# Altium footprint library 我的封装库.PcbLib: 90 footprints (part 1 of 6)
Each footprint in its own frame and in the unit in brackets; x right, y up, seen from the top. Pads: shape width x height; smd on the part's side, far side on the other; paste and mask are expansions set on the pad; w line width, h text height; cw(c..) or ccw(c..) is an arc to the next point about the centre after c.
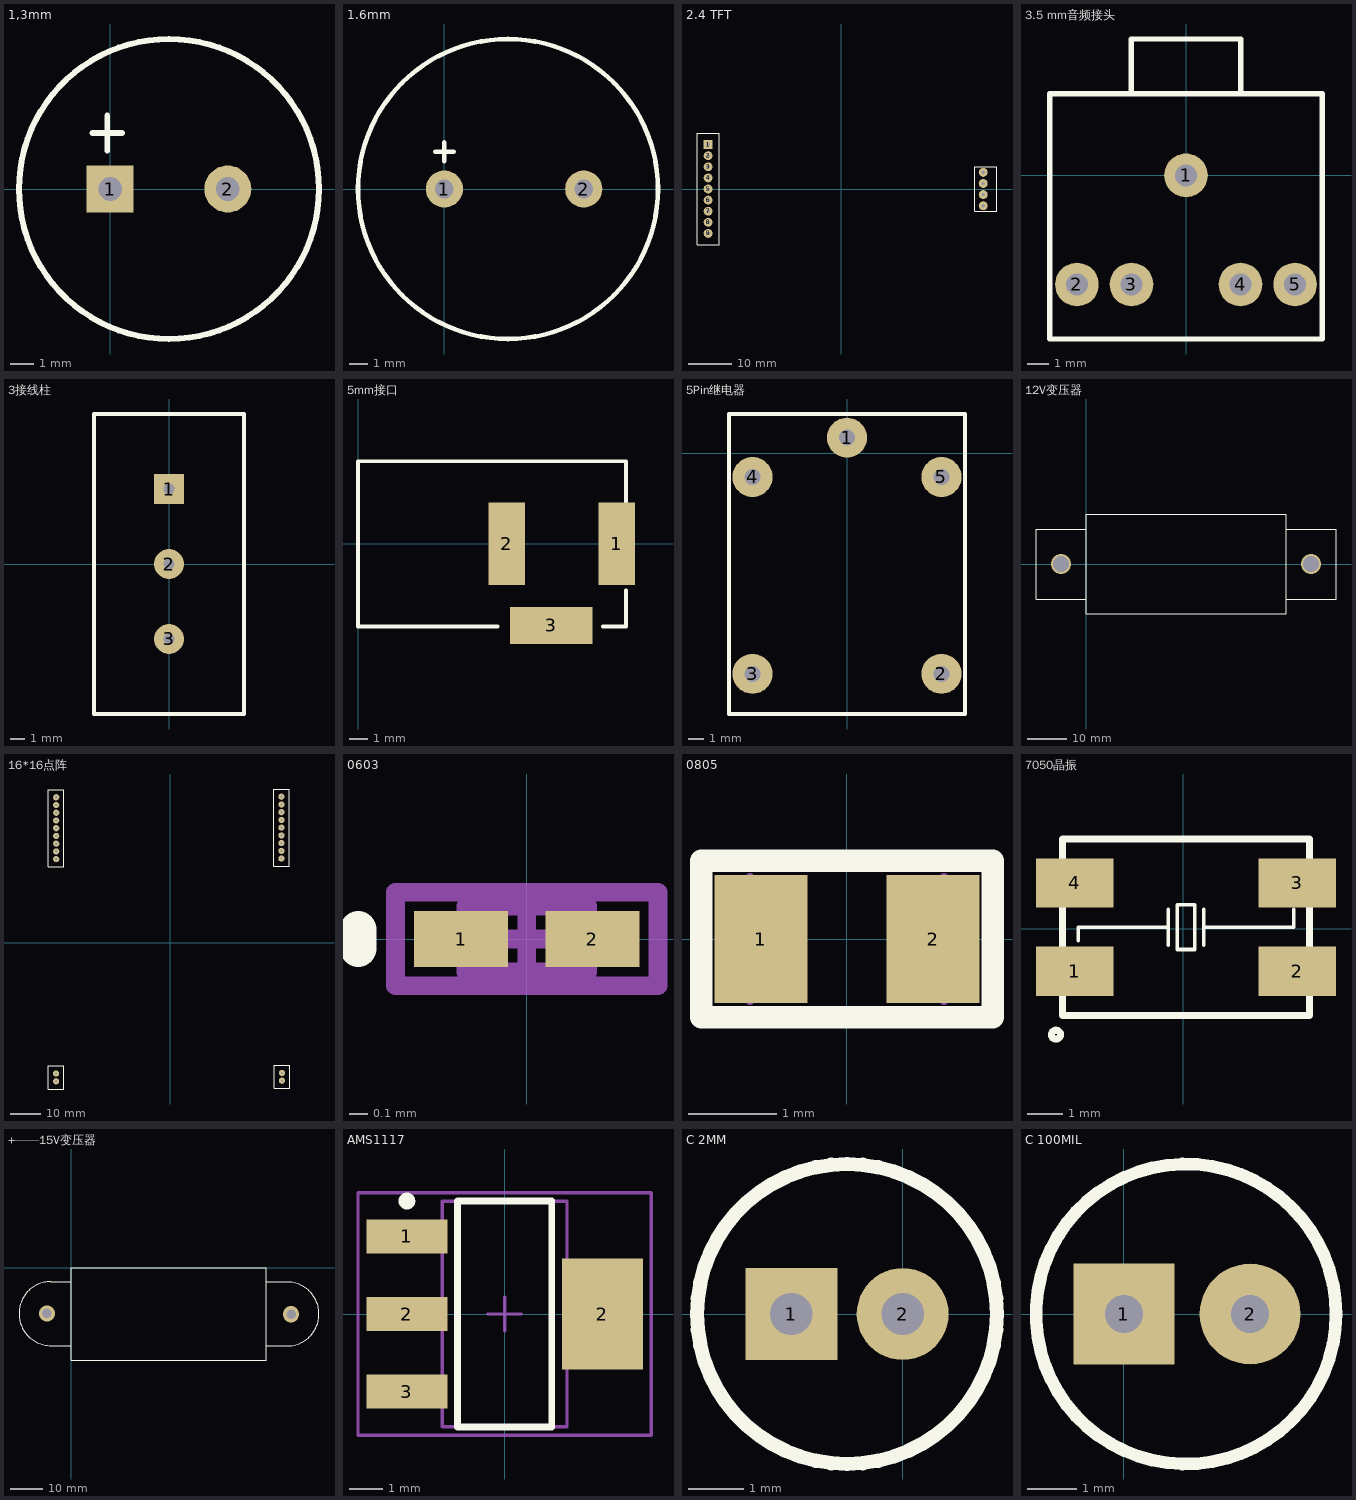
[diagram p0: the footprints below, top view; thin cyan lines are the x and y axes]

## 1,3mm [mil]
pads (2):
  rect 80x80 hole 40: 1(0,0)
  round 80 hole 40: 2(200,0)
Top Overlay:
  circle w10: c100,0 r255
  lines w10: -30,95 20,95 ; -5,65 -5,125

## 1.6mm [mil]
pads (2):
  round 80 hole 40: 1(0,0) 2(300,0)
Top Overlay:
  circle w10: c137,0 r323
  lines w10: -20,80 20,80 ; 0,60 0,100

## 2.4 TFT [mil]
pads (13):
  rect 80x80 hole 30: 1(-1200,400)
  round 80 hole 30: 2(-1200,300) 3(-1200,200) 4(-1200,100) 5(-1200,0) 6(-1200,-100) 7(-1200,-200) 8(-1200,-300) 9(-1200,-400) 10(1275.59,-150.18) 11(1275.59,-50.18) 12(1275.59,49.82) 13(1275.59,149.82)
Top Overlay:
  lines w10: -1188.98,0 -1181.1,0 ; -1300,-500 -1100,-500 -1100,500 -1300,500 -1300,-500 ; 1200,-200 1400,-200 1400,200 1200,200 1200,-200

## 3.5 mm音频接头 [mil]
pads (5):
  round 80 hole 40: 1(0,0) 2(-200,-200) 3(-100,-200) 4(100,-200) 5(200,-200)
Top Overlay:
  lines w10: -100,150 -100,250 100,250 100,150 ; -250,-300 -250,150 250,150 250,-300 -250,-300

## 3接线柱 [mil]
pads (3):
  rect 80x80 hole 30: 1(0,200)
  round 80 hole 30: 2(0,0) 3(0,-200)
Top Overlay:
  lines w10: -200,-400 -200,400 200,400 200,-400 -200,-400

## 5mm接口 [mm]
pads (3):
  rect 2x4.5 all layers, no hole: 1(14.097,0) 2(8.112,0)
  rect 4.5x2 all layers, no hole: 3(10.541,-4.445)
Top Overlay:
  lines w0.2: 7.62,-4.5 0,-4.5 0,4.5 14.6,4.5 14.6,2.2 ; 13.335,-4.5 14.6,-4.5 14.6,-2.54

## 5Pin继电器 [mm]
pads (5):
  round 2.54 hole 1.016: 1(0,1) 2(6,-14) 3(-6,-14) 4(-6,-1.5) 5(6,-1.5)
Top Overlay:
  lines w0.254: -7.5,-16.55 -7.5,2.5 7.5,2.5 7.5,-16.55 -7.5,-16.55

## 12V变压器 [mil]
via -250,0 diameter 196.85 hole 157.48
via 2250,0 diameter 196.85 hole 157.48
Top Overlay:
  lines w10: 0,-350 -500,-350 -500,-100 -500,350 0,350 ; 2000,-350 2500,-350 2500,350 2000,350 ; 0,-500 0,500 2000,500 2000,-500 0,-500

## 16*16点阵 [mil]
height 393.7
pads (22):
  round 80 hole 30: 1(-1476.38,1882.68) 2(-1476.38,1782.68) 3(-1476.38,1682.68) 4(-1476.38,1582.68) 5(-1476.38,1482.68) 6(-1476.38,1382.68) 7(-1476.38,1282.68) 8(-1476.38,1182.68) 9(-1476.38,1082.68) 10(-1477.95,-1690.55) 11(-1477.95,-1790.55) 12(1443.31,-1783.46) 13(1443.31,-1683.46) 14(1437.01,1089.76) 15(1437.01,1189.76) 16(1437.01,1289.76) 17(1437.01,1389.76) 18(1437.01,1489.76) 19(1437.01,1589.76) 20(1437.01,1689.76) 21(1437.01,1789.76) 22(1437.01,1889.76)
Top Overlay:
  lines w10: -1476.38,-1692.91 -1476.38,-1673.23 ; -1577.95,-1890.55 -1377.95,-1890.55 -1377.95,-1590.55 -1577.95,-1590.55 -1577.95,-1890.55 ; -1576.38,982.68 -1376.38,982.68 -1376.38,1982.68 -1576.38,1982.68 -1576.38,982.68 ; 1337.01,989.76 1537.01,989.76 1537.01,1989.76 1337.01,1989.76 1337.01,989.76 ; 1343.31,-1883.46 1543.31,-1883.46 1543.31,-1583.46 1343.31,-1583.46 1343.31,-1883.46

## 0603 [mm]
pads (2):
  rect 0.5x0.3 smd: 1(-0.35,0) 2(0.35,0)
Top Overlay:
  lines w0.2: -0.9,-0.05 -0.9,0.05
Mechanical 13:
  lines w0.1: -0.325,-0.175 0.325,-0.175 0.325,0.175 -0.325,0.175 -0.325,-0.175
Mechanical 15:
  lines w0.1: -0.175,0 0.175,0 ; 0,-0.175 0,0.175 ; -0.7,-0.25 0.7,-0.25 0.7,0.25 -0.7,0.25 -0.7,-0.25
3D body: height 0.55, standoff 0, extent -0.325,-0.175 0.325,0.175

## 0805 [mm] "Chip Capacitor, 2-Leads, Body 2.0x1.3mm, IPC Medium Density"
height 0.6
pads (2):
  rect 1.05x1.45 smd: 1(-0.975,0) 2(0.975,0)
Top Overlay:
  lines w0.254: -1.651,-0.889 1.651,-0.889 1.651,0.889 -1.651,0.889 -1.651,-0.889
Mechanical 13:
  lines w0.1: -1.1,-0.7 -1.1,0.7 ; 1.1,-0.7 1.1,0.7

## 7050晶振 [mm]
pads (4):
  rect 2.2x1.4 smd: 1(-3.074,-1.21) 2(3.226,-1.21) 3(3.226,1.29) 4(-3.074,1.29)
Top Overlay:
  circle w0.2: c-3.607,-3.008 r0.127
  lines w0.1: -2.972,-0.341 -2.972,0.04 -0.432,0.04 ; -0.432,-0.468 -0.432,0.548 ; 0.584,-0.468 0.584,0.548 ; 0.584,0.04 3.124,0.04 3.124,0.548 ; -0.178,-0.595 0.33,-0.595 0.33,0.675 -0.178,0.675 -0.178,-0.595
  lines w0.2: -3.424,-2.46 -3.424,2.54 3.576,2.54 3.576,-2.46 -3.424,-2.46
3D body: height 1.31, standoff 0, extent -3.5,-2.5 3.5,2.5

## +——15V变压器 [mil]
via -300,-555 diameter 196.85 hole 118.11
via 2680,-565 diameter 196.85 hole 118.11
Top Overlay:
  lines w10: -250,-950 0,-950 ; -250,-947.51 cw(c-250,-557.5) -250,-167.49 ; -250,-170 0,-170 ; 2380,-950 2630,-950 ; 2380,-170 2630,-170 ; 2630,-952.51 ccw(c2630,-562.5) 2630,-172.49 ; 0,-1125 2375,-1125 2375,0 0,0 0,-1125

## AMS1117 [mm]
pads (4):
  rect 2.4x1 smd: 1(-2.9,2.3) 2(-2.9,0) 3(-2.9,-2.3)
  rect 2.4x3.3 smd: 2(2.9,0)
Top Overlay:
  circle w0.25: c-2.9,3.35 r0.125
  lines w0.2: -1.4,-3.35 1.4,-3.35 1.4,3.35 -1.4,3.35 -1.4,-3.35
Mechanical 13:
  lines w0.1: -1.85,-3.35 1.85,-3.35 1.85,3.35 -1.85,3.35 -1.85,-3.35
Mechanical 15:
  lines w0.1: -0.5,0 0.5,0 ; 0,-0.5 0,0.5 ; -4.35,-3.6 4.35,-3.6 4.35,3.6 -4.35,3.6 -4.35,-3.6
3D body: height 1.7, standoff 0, extent -1.85,-3.35 1.85,3.35

## C 2MM [mil]
pads (2):
  rect 65x65 hole 30: 1(-78.74,0)
  round 65 hole 30: 2(0,0)
Top Overlay:
  circle w10: c-39.37,0 r106.01

## C 100MIL [mil]
pads (2):
  rect 80x80 hole 30: 1(0,0)
  round 80 hole 30: 2(100,0)
Top Overlay:
  circle w10: c49.21,0 r118.93